# Altium schematic symbol library FPGA_Xilinx_Virtex7.SchLib: 34 symbols (part 5 of 26) (continued)
## XC7VH580T-FLG1155 (continued)

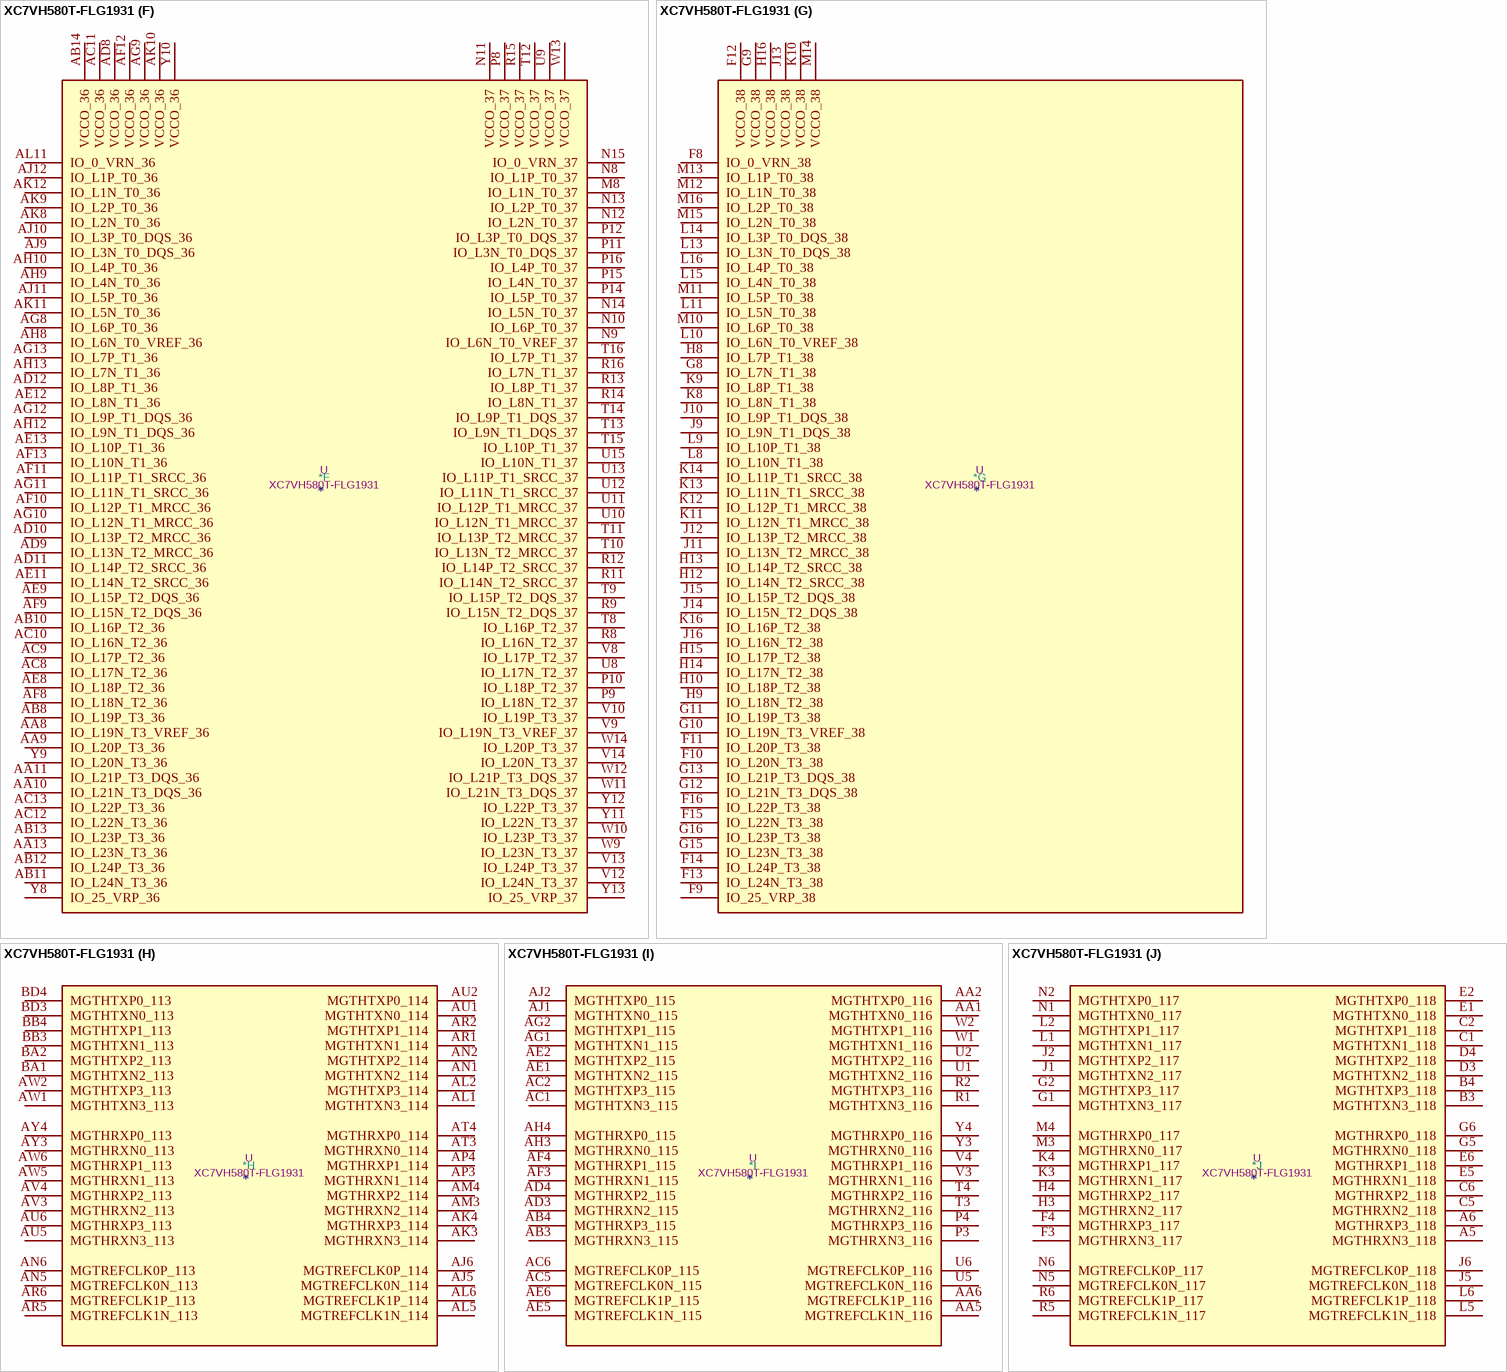
[diagram p29: symbol XC7VH580T-FLG1931]

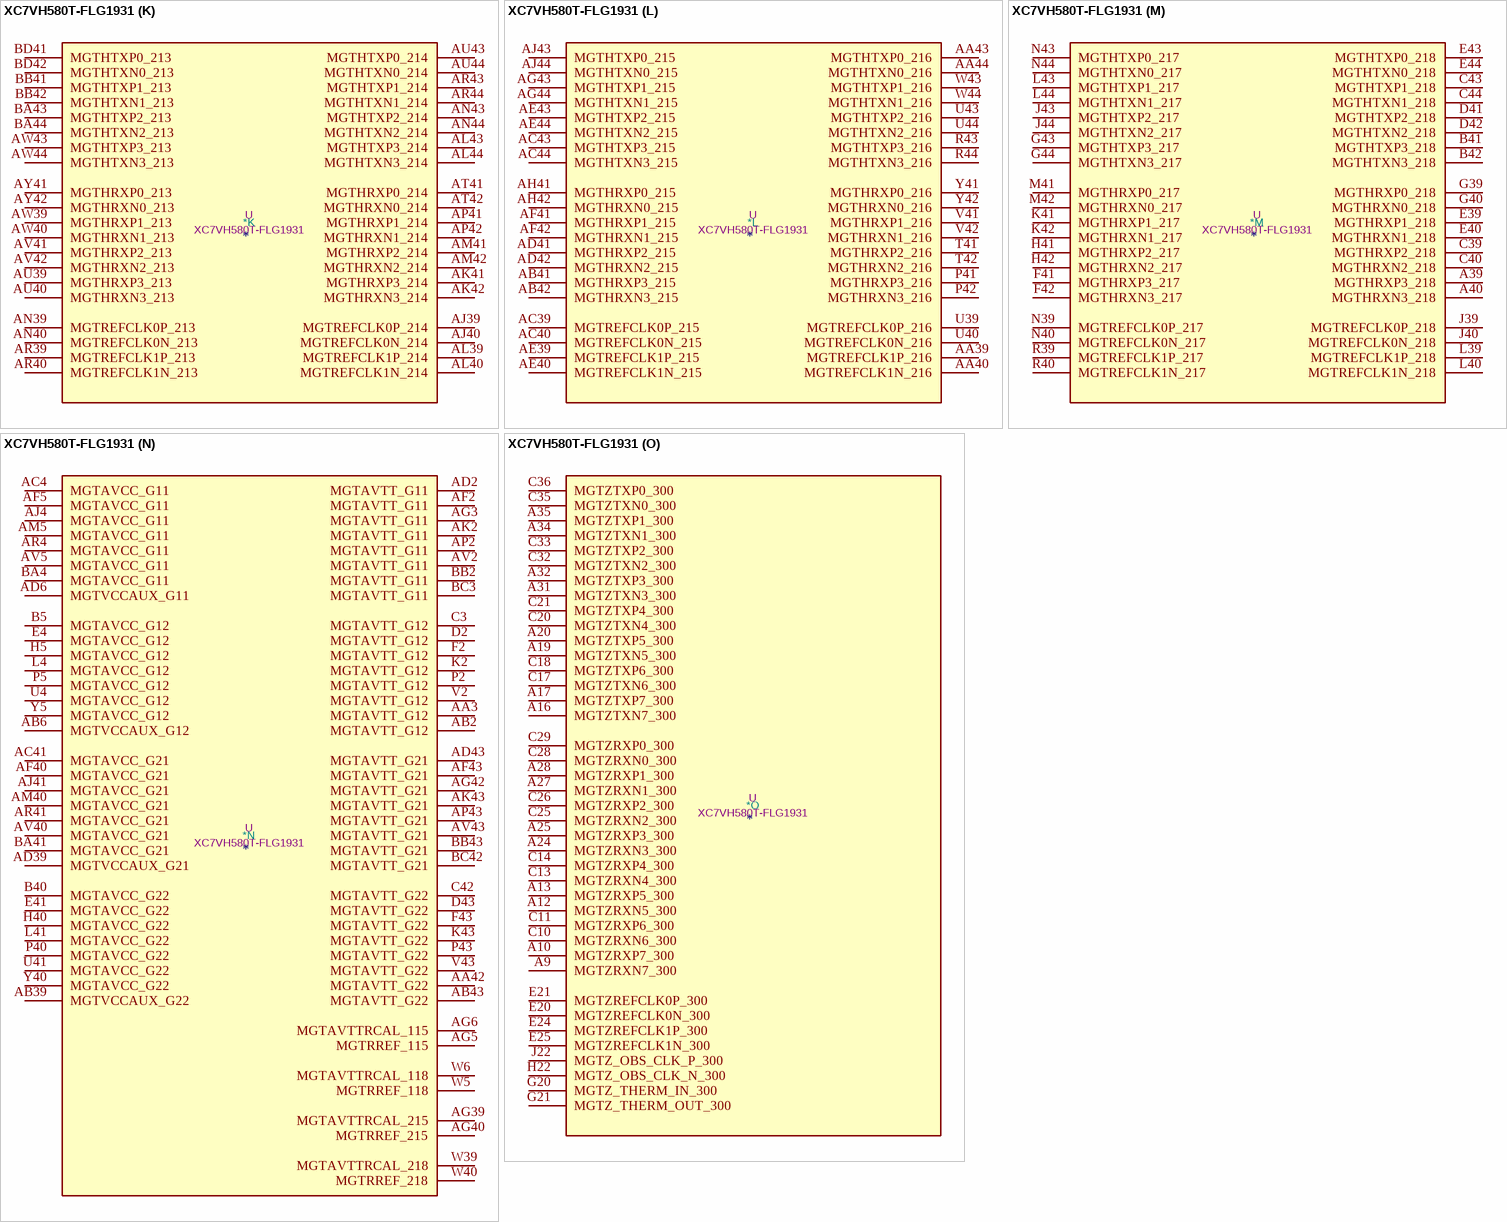
[diagram p30: symbol XC7VH580T-FLG1931]

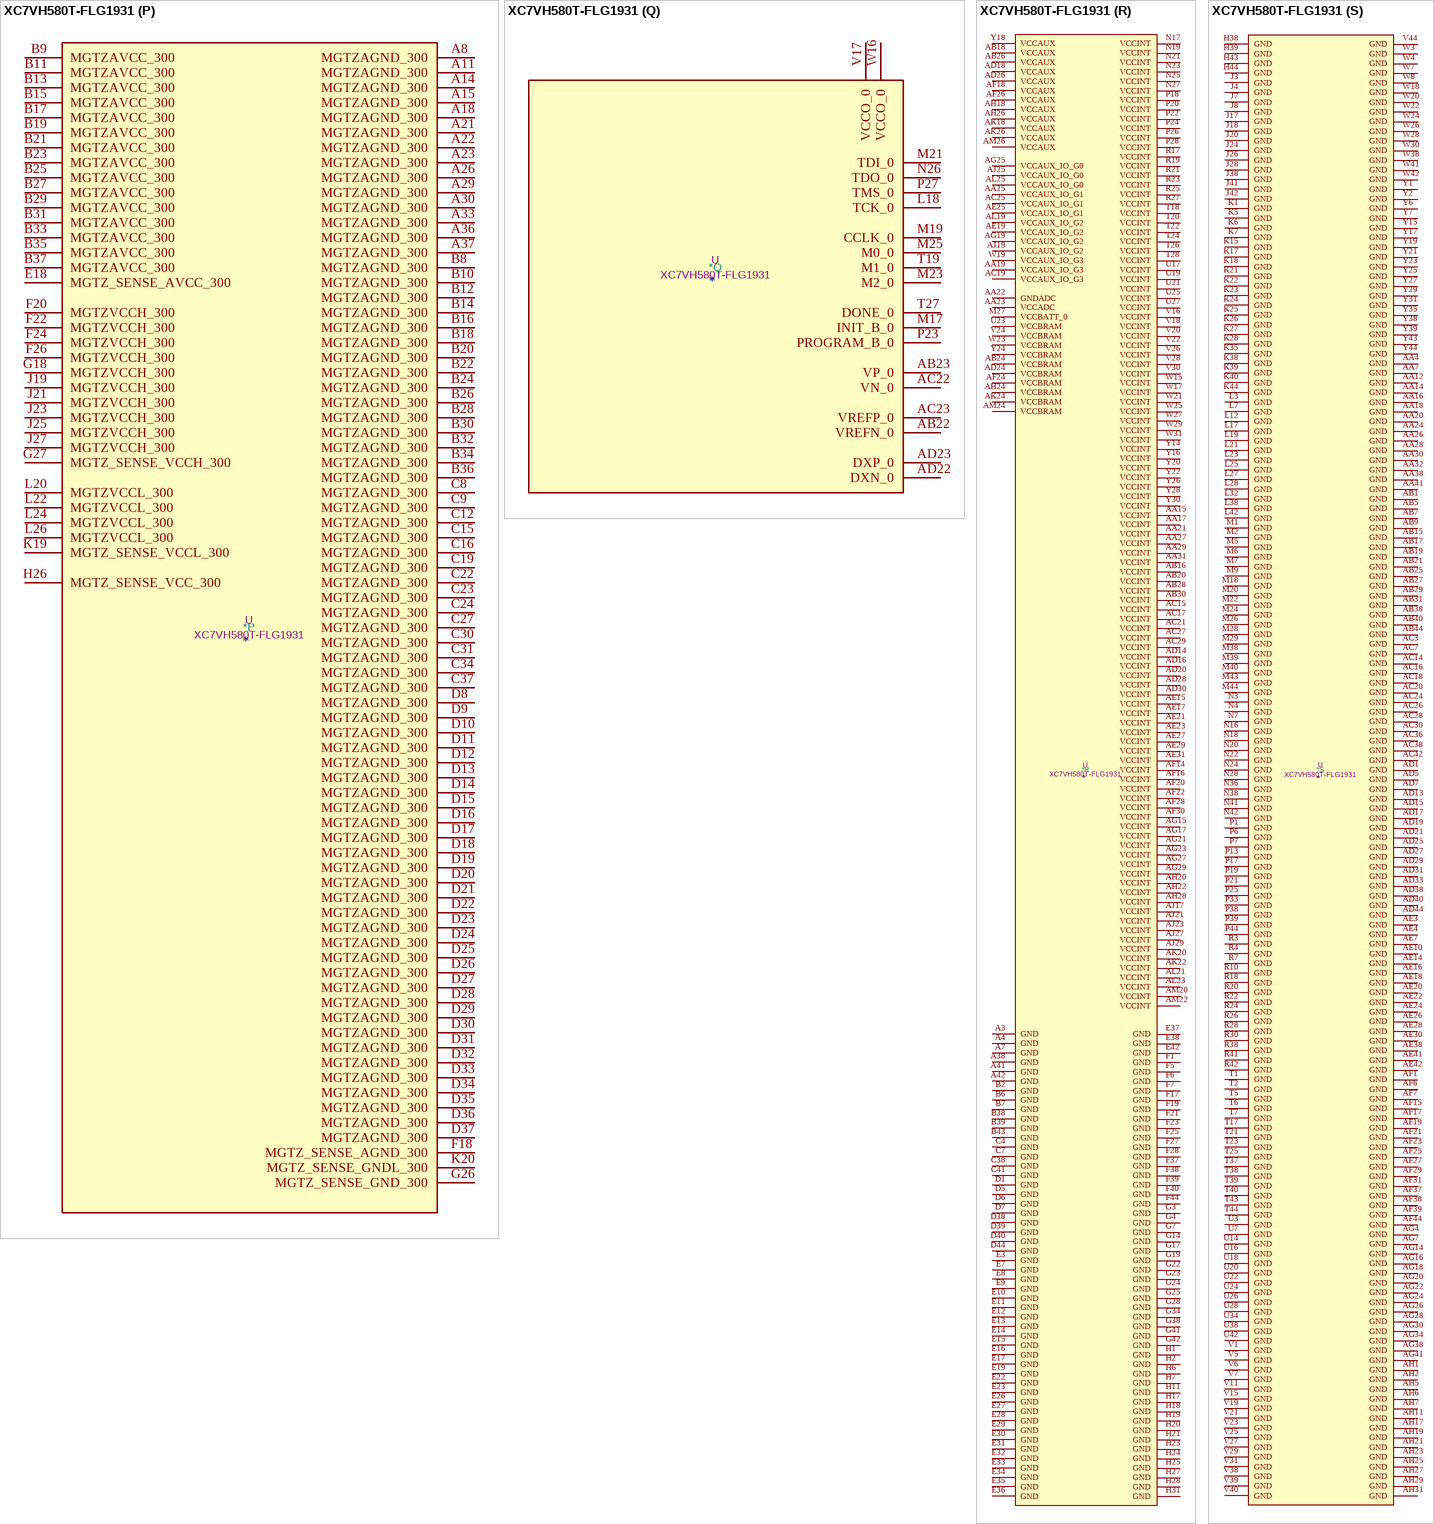
[diagram p31: symbol XC7VH580T-FLG1931]

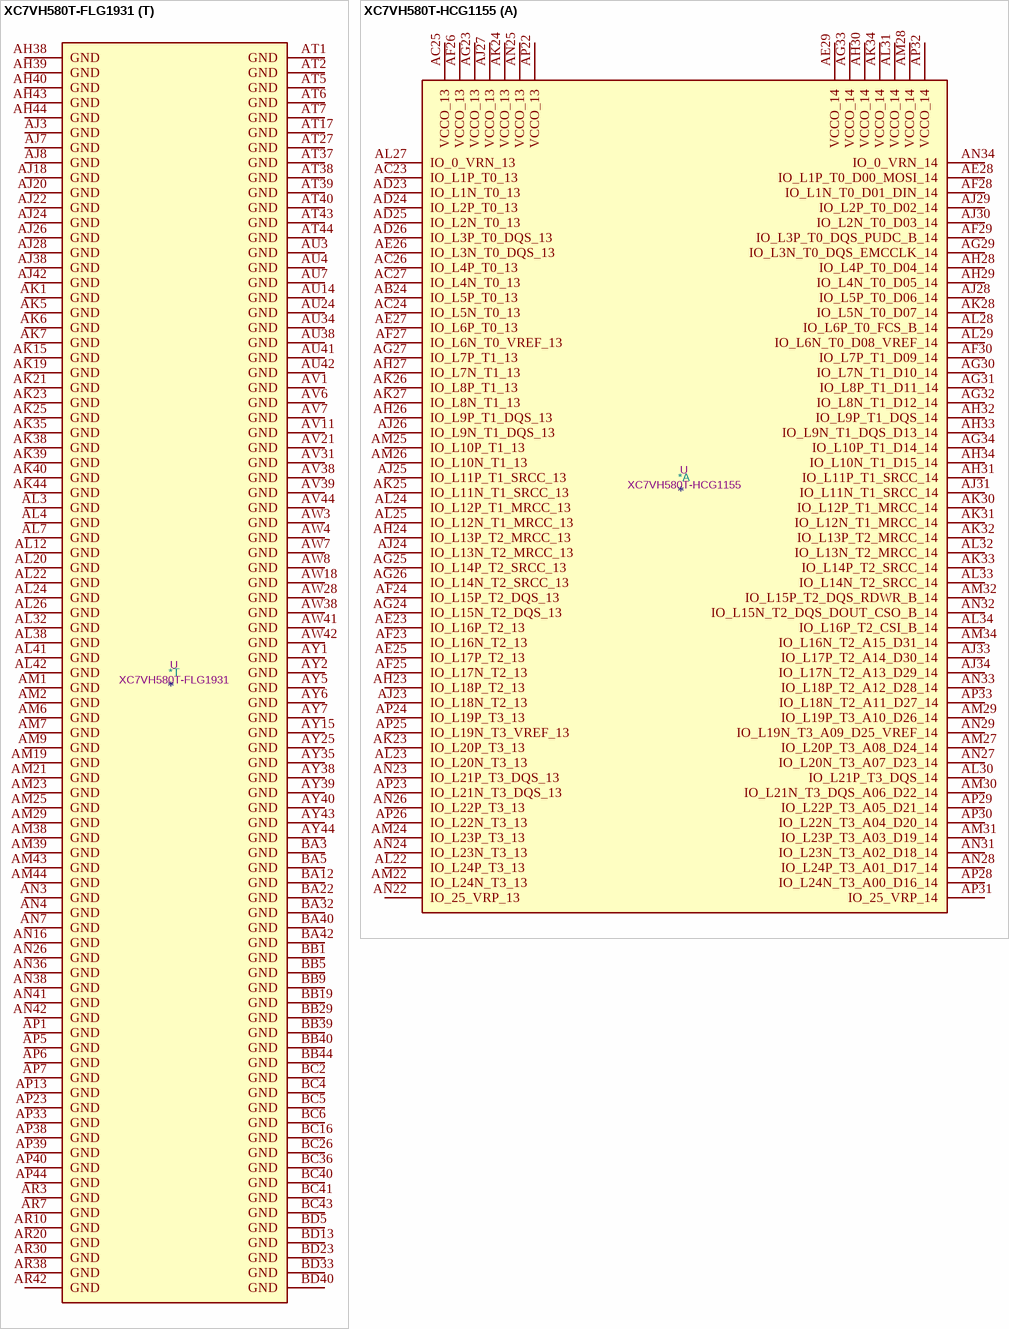
[diagram p32: symbols XC7VH580T-FLG1931 to XC7VH580T-HCG1155]

## XC7VH580T-FLG1931
designator *  value XC7VH580T-FLG1931  Reference: U
ki_keywords: FPGA; ki_description: Virtex 7 HT 580 XC7VH580T-FLG1931
part A pins: AH30 IO_L20P_T3_A08_D24_14, AJ30 IO_L20N_T3_A07_D23_14, AJ31 IO_L16P_T2_CSI_B_14, AJ32 IO_L7P_T1_D09_14, AK30 VCCO_14, AK31 IO_L16N_T2_A15_D31_14, AK32 IO_L7N_T1_D10_14, AL30 IO_L24P_T3_A01_D17_14, AL31 IO_L18P_T2_A12_D28_14, AL35 IO_L1P_T0_13, AL36 IO_L3P_T0_DQS_13, AL37 VCCO_13, AM30 IO_L24N_T3_A00_D16_14, AM31 IO_L18N_T2_A11_D27_14, AM32 IO_L9P_T1_DQS_14, AM33 IO_L5P_T0_D06_14, AM34 VCCO_13, AM35 IO_L1N_T0_13, AM36 IO_L3N_T0_DQS_13, AM37 IO_L5P_T0_13, AN30 IO_L22P_T3_A05_D21_14, AN31 VCCO_14, AN32 IO_L9N_T1_DQS_D13_14, AN33 IO_L5N_T0_D07_14, AN34 IO_L4P_T0_13, AN35 IO_L2P_T0_13, AN37 IO_L5N_T0_13, AP30 IO_L22N_T3_A04_D20_14, AP31 IO_L13P_T2_MRCC_14, AP32 IO_L11P_T1_SRCC_14, AP34 IO_L4N_T0_13, AP35 IO_L2N_T0_13, AP36 IO_L6P_T0_13, AP37 IO_L7P_T1_13, AR31 IO_L13N_T2_MRCC_14, AR32 IO_L11N_T1_SRCC_14, AR33 IO_L1P_T0_D00_MOSI_14, AR34 IO_L10P_T1_13, AR35 VCCO_13, AR36 IO_L6N_T0_VREF_13, AR37 IO_L7N_T1_13, AT30 IO_L21P_T3_DQS_14, AT31 IO_L14P_T2_SRCC_14, AT32 VCCO_14, AT33 IO_L1N_T0_D01_DIN_14, AT34 IO_L10N_T1_13, AT35 IO_L11P_T1_SRCC_13, AT36 IO_L12P_T1_MRCC_13, AU30 IO_L21N_T3_DQS_A06_D22_14, AU31 IO_L14N_T2_SRCC_14, AU32 IO_L12P_T1_MRCC_14, AU33 IO_L3P_T0_DQS_PUDC_B_14, AU35 IO_L11N_T1_SRCC_13, AU36 IO_L12N_T1_MRCC_13, AU37 IO_L9P_T1_DQS_13, AV30 IO_L23P_T3_A03_D19_14, AV32 IO_L12N_T1_MRCC_14, AV33 IO_L3N_T0_DQS_EMCCLK_14, AV34 IO_L16P_T2_13, AV35 IO_L13P_T2_MRCC_13, AV36 VCCO_13, AV37 IO_L9N_T1_DQS_13, AW30 IO_L23N_T3_A02_D18_14, AW31 IO_L15P_T2_DQS_RDWR_B_14, AW32 IO_L8P_T1_D11_14, AW33 VCCO_14, AW34 IO_L16N_T2_13, AW35 IO_L13N_T2_MRCC_13, AW36 IO_L14P_T2_SRCC_13, AW37 IO_L8P_T1_13, AY30 VCCO_14, AY31 IO_L15N_T2_DQS_DOUT_CSO_B_14, AY32 IO_L8N_T1_D12_14, AY33 IO_L4P_T0_D04_14, AY34 IO_L17P_T2_13, AY36 IO_L14N_T2_SRCC_13, AY37 IO_L8N_T1_13, BA30 IO_L19P_T3_A10_D26_14, BA31 IO_L17P_T2_A14_D30_14, BA33 IO_L4N_T0_D05_14, BA34 IO_L17N_T2_13, BA35 IO_L15P_T2_DQS_13, BA36 IO_L18P_T2_13, BA37 VCCO_13, BA38 IO_L22P_T3_13, BA39 IO_L22N_T3_13, BB30 IO_L19N_T3_A09_D25_VREF_14, BB31 IO_L17N_T2_A13_D29_14, BB32 IO_L10P_T1_D14_14, BB33 IO_L6P_T0_FCS_B_14, BB34 VCCO_13, BB35 IO_L15N_T2_DQS_13, BB36 IO_L18N_T2_13, BB37 IO_L21P_T3_DQS_13, BB38 IO_L19P_T3_13, BC30 IO_25_VRP_14, BC31 VCCO_14, BC32 IO_L10N_T1_D15_14, BC33 IO_L6N_T0_D08_VREF_14, BC34 IO_L23P_T3_13, BC35 IO_L24P_T3_13, BC37 IO_L21N_T3_DQS_13, BC38 IO_L19N_T3_VREF_13, BC39 IO_25_VRP_13, BD30 IO_0_VRN_14, BD31 IO_L2P_T0_D02_14, BD32 IO_L2N_T0_D03_14, BD34 IO_L23N_T3_13, BD35 IO_L24N_T3_13, BD36 IO_L20P_T3_13, BD37 IO_L20N_T3_13, BD38 VCCO_13, BD39 IO_0_VRN_13
part B pins: AA33 IO_L2P_T0_16, AA34 IO_L2N_T0_16, AA35 IO_L3P_T0_DQS_16, AA36 IO_L3N_T0_DQS_16, AA37 VCCO_16, AB32 IO_L1P_T0_16, AB33 IO_L1N_T0_16, AB34 VCCO_16, AB35 IO_L5P_T0_16, AB36 IO_L6P_T0_16, AB37 IO_L6N_T0_VREF_16, AC31 VCCO_16, AC32 IO_L16P_T2_16, AC33 IO_L4P_T0_16, AC34 IO_L4N_T0_16, AC35 IO_L5N_T0_16, AC37 IO_L7P_T1_16, AD32 IO_L16N_T2_16, AD34 IO_L10P_T1_16, AD35 IO_L8P_T1_16, AD36 IO_L8N_T1_16, AD37 IO_L7N_T1_16, AE32 IO_L15P_T2_DQS_16, AE33 IO_L15N_T2_DQS_16, AE34 IO_L10N_T1_16, AE35 VCCO_16, AE36 IO_L9P_T1_DQS_16, AE37 IO_L9N_T1_DQS_16, AF32 VCCO_16, AF33 IO_L11P_T1_SRCC_16, AF34 IO_L11N_T1_SRCC_16, AF35 IO_L12P_T1_MRCC_16, AF36 IO_L12N_T1_MRCC_16, AG31 IO_L17P_T2_16, AG32 IO_L13P_T2_MRCC_16, AG33 IO_L13N_T2_MRCC_16, AG35 IO_L14P_T2_SRCC_16, AG36 IO_L14N_T2_SRCC_16, AG37 IO_L20P_T3_16, AH32 IO_L17N_T2_16, AH33 IO_L18P_T2_16, AH34 IO_L18N_T2_16, AH35 IO_L24P_T3_16, AH36 VCCO_16, AH37 IO_L20N_T3_16, AJ33 VCCO_16, AJ34 IO_L19P_T3_16, AJ35 IO_L24N_T3_16, AJ36 IO_L21P_T3_DQS_16, AJ37 IO_L21N_T3_DQS_16, AK27 IO_25_VRP_15, AK28 IO_L18P_T2_A24_15, AK29 IO_L22P_T3_A17_15, AK33 IO_L23P_T3_16, AK34 IO_L19N_T3_VREF_16, AK36 IO_L22P_T3_16, AK37 IO_L22N_T3_16, AL27 VCCO_15, AL28 IO_L18N_T2_A23_15, AL29 IO_L22N_T3_A16_15, AL33 IO_L23N_T3_16, AL34 IO_25_VRP_16, AM27 IO_L7P_T1_AD2P_15, AM28 IO_L16P_T2_A28_15, AN25 IO_L1P_T0_AD0P_15, AN27 IO_L7N_T1_AD2N_15, AN28 IO_L16N_T2_A27_15, AN29 IO_L20P_T3_A20_15, AP25 IO_L1N_T0_AD0N_15, AP26 IO_L5P_T0_AD9P_15, AP27 IO_L9P_T1_DQS_AD3P_15, AP28 VCCO_15, AP29 IO_L20N_T3_A19_15, AR25 VCCO_15, AR26 IO_L5N_T0_AD9N_15, AR27 IO_L9N_T1_DQS_AD3N_15, AR28 IO_L14P_T2_SRCC_15, AR29 IO_L24P_T3_RS1_15, AT25 IO_L4P_T0_15, AT26 IO_L3P_T0_DQS_AD1P_15, AT28 IO_L14N_T2_SRCC_15, AT29 IO_L24N_T3_RS0_15, AU25 IO_L4N_T0_15, AU26 IO_L3N_T0_DQS_AD1N_15, AU27 IO_L11P_T1_SRCC_15, AU28 IO_L13P_T2_MRCC_15, AU29 VCCO_15, AV25 IO_0_VRN_15, AV26 VCCO_15, AV27 IO_L11N_T1_SRCC_15, AV28 IO_L13N_T2_MRCC_15, AV29 IO_L21P_T3_DQS_15, AW26 IO_L6P_T0_15, AW27 IO_L12P_T1_MRCC_15, AW29 IO_L21N_T3_DQS_A18_15, AY26 IO_L6N_T0_VREF_15, AY27 IO_L12N_T1_MRCC_15, AY28 IO_L15P_T2_DQS_15, AY29 IO_L19P_T3_A22_15, BA26 IO_L2P_T0_AD8P_15, BA27 VCCO_15, BA28 IO_L15N_T2_DQS_ADV_B_15, BA29 IO_L19N_T3_A21_VREF_15, BB26 IO_L2N_T0_AD8N_15, BB27 IO_L10P_T1_AD11P_15, BB28 IO_L17P_T2_A26_15, BC27 IO_L10N_T1_AD11N_15, BC28 IO_L17N_T2_A25_15, BC29 IO_L23P_T3_FOE_B_15, BD26 IO_L8P_T1_AD10P_15, BD27 IO_L8N_T1_AD10N_15, BD28 VCCO_15, BD29 IO_L23N_T3_FWE_B_15, Y37 IO_0_VRN_16
part C pins: F29 IO_L22P_T3_18, F30 IO_L22N_T3_18, F31 IO_25_VRP_18, F32 VCCO_18, F33 IO_L24P_T3_18, F34 IO_L24N_T3_18, F35 IO_L20P_T3_18, F36 IO_L20N_T3_18, G29 VCCO_18, G30 IO_L23P_T3_18, G31 IO_L23N_T3_18, G32 IO_L21P_T3_DQS_18, G33 IO_L21N_T3_DQS_18, G35 IO_L19P_T3_18, G36 IO_L19N_T3_VREF_18, G37 IO_L7N_T1_18, H29 IO_L17P_T2_18, H30 IO_L17N_T2_18, H32 IO_L15P_T2_DQS_18, H33 IO_L15N_T2_DQS_18, H34 IO_L18P_T2_18, H35 IO_L18N_T2_18, H36 VCCO_18, H37 IO_L7P_T1_18, J29 IO_L16P_T2_18, J30 IO_L16N_T2_18, J31 IO_L14P_T2_SRCC_18, J32 IO_L14N_T2_SRCC_18, J33 VCCO_18, J34 IO_L13P_T2_MRCC_18, J35 IO_L13N_T2_MRCC_18, J36 IO_L9P_T1_DQS_18, J37 IO_L9N_T1_DQS_18, K29 IO_L10N_T1_18, K30 VCCO_18, K31 IO_L11P_T1_SRCC_18, K32 IO_L11N_T1_SRCC_18, K33 IO_L12P_T1_MRCC_18, K34 IO_L12N_T1_MRCC_18, K36 IO_L8N_T1_18, K37 IO_0_VRN_18, L29 IO_L10P_T1_18, L30 IO_L4P_T0_18, L31 IO_L4N_T0_18, L33 IO_L3P_T0_DQS_18, L34 IO_L3N_T0_DQS_18, L35 IO_L6N_T0_VREF_18, L36 IO_L8P_T1_18, L37 VCCO_18, M30 IO_L2P_T0_18, M31 IO_L2N_T0_18, M32 IO_L1P_T0_18, M33 IO_L1N_T0_18, M34 VCCO_18, M35 IO_L6P_T0_18, M36 IO_L5P_T0_18, M37 IO_L5N_T0_18, N29 IO_L4P_T0_17, N30 IO_L4N_T0_17, N31 VCCO_17, N32 IO_L2P_T0_17, N33 IO_L2N_T0_17, N34 IO_L6P_T0_17, N35 IO_L6N_T0_VREF_17, N37 IO_L1N_T0_17, P29 IO_L5P_T0_17, P30 IO_L5N_T0_17, P31 IO_L3P_T0_DQS_17, P32 IO_L3N_T0_DQS_17, P34 IO_0_VRN_17, P35 IO_L15P_T2_DQS_17, P36 IO_L15N_T2_DQS_17, P37 IO_L1P_T0_17, R29 IO_L8N_T1_17, R31 IO_L7P_T1_17, R32 IO_L7N_T1_17, R33 IO_L16P_T2_17, R34 IO_L16N_T2_17, R35 VCCO_17, R36 IO_L18P_T2_17, R37 IO_L18N_T2_17, T29 IO_L8P_T1_17, T30 IO_L9N_T1_DQS_17, T31 IO_L10N_T1_17, T32 VCCO_17, T33 IO_L13P_T2_MRCC_17, T34 IO_L13N_T2_MRCC_17, T35 IO_L14P_T2_SRCC_17, T36 IO_L14N_T2_SRCC_17, U29 VCCO_17, U30 IO_L9P_T1_DQS_17, U31 IO_L10P_T1_17, U32 IO_L11P_T1_SRCC_17, U33 IO_L11N_T1_SRCC_17, U35 IO_L12P_T1_MRCC_17, U36 IO_L12N_T1_MRCC_17, U37 IO_L17N_T2_17, V32 IO_L20P_T3_17, V33 IO_L20N_T3_17, V34 IO_L24P_T3_17, V35 IO_L24N_T3_17, V36 VCCO_17, V37 IO_L17P_T2_17, W32 IO_L19N_T3_VREF_17, W33 VCCO_17, W34 IO_L21P_T3_DQS_17, W35 IO_L21N_T3_DQS_17, W36 IO_L23P_T3_17, W37 IO_L23N_T3_17, Y32 IO_L19P_T3_17, Y33 IO_L22P_T3_17, Y34 IO_L22N_T3_17, Y36 IO_25_VRP_17
part D pins: AH14 IO_L6P_T0_33, AH15 IO_L10P_T1_33, AJ13 VCCO_33, AJ14 IO_L6N_T0_VREF_33, AJ15 IO_L10N_T1_33, AK13 IO_L3P_T0_DQS_33, AK14 IO_L2P_T0_33, AL13 IO_L3N_T0_DQS_33, AL14 IO_L2N_T0_33, AL15 IO_L7P_T1_33, AM12 IO_L1P_T0_33, AM13 IO_L4P_T0_33, AM14 VCCO_33, AM15 IO_L7N_T1_33, AN11 VCCO_32, AN12 IO_L1N_T0_33, AN13 IO_L4N_T0_33, AN14 IO_L9P_T1_DQS_33, AN15 IO_L8P_T1_33, AP8 VCCO_32, AP12 IO_L5P_T0_33, AP14 IO_L9N_T1_DQS_33, AP15 IO_L8N_T1_33, AR12 IO_L5N_T0_33, AR13 IO_L12P_T1_MRCC_33, AR14 IO_L11P_T1_SRCC_33, AR15 VCCO_33, AT12 VCCO_33, AT13 IO_L12N_T1_MRCC_33, AT14 IO_L11N_T1_SRCC_33, AT15 IO_L18P_T2_33, AU9 VCCO_32, AU12 IO_L15P_T2_DQS_33, AU13 IO_L13P_T2_MRCC_33, AU15 IO_L18N_T2_33, AV12 IO_L15N_T2_DQS_33, AV13 IO_L13N_T2_MRCC_33, AV14 IO_L14P_T2_SRCC_33, AV15 IO_L16P_T2_33, AW12 IO_L17P_T2_33, AW13 VCCO_33, AW14 IO_L14N_T2_SRCC_33, AW15 IO_L16N_T2_33, AY10 VCCO_32, AY12 IO_L17N_T2_33, AY13 IO_L19P_T3_33, AY14 IO_L20P_T3_33, BA7 VCCO_32, BA13 IO_L19N_T3_VREF_33, BA14 IO_L20N_T3_33, BA15 IO_L23P_T3_33, BB12 IO_L21N_T3_DQS_33, BB13 IO_L21P_T3_DQS_33, BB14 VCCO_33, BB15 IO_L23N_T3_33, BC11 VCCO_32, BC12 IO_L24N_T3_33, BC13 IO_L24P_T3_33, BC14 IO_L22N_T3_33, BC15 IO_L22P_T3_33, BD8 VCCO_32, BD12 IO_0_VRN_33, BD14 IO_25_VRP_33
part E pins: AH16 VCCO_34, AJ16 IO_L23P_T3_34, AK16 IO_L23N_T3_34, AK17 IO_L19P_T3_34, AL16 IO_L19N_T3_VREF_34, AL17 VCCO_34, AL18 IO_L21P_T3_DQS_34, AM16 IO_L24N_T3_34, AM17 IO_L24P_T3_34, AM18 IO_L21N_T3_DQS_34, AN17 IO_L20N_T3_34, AN18 IO_L20P_T3_34, AN19 IO_L22P_T3_34, AN20 IO_L22P_T3_35, AN21 VCCO_35, AN22 IO_L7N_T1_AD6N_35, AN23 IO_L7P_T1_AD6P_35, AN24 IO_L1P_T0_AD4P_35, AP16 IO_L16P_T2_34, AP17 IO_L17P_T2_34, AP18 VCCO_34, AP19 IO_L22N_T3_34, AP20 IO_L22N_T3_35, AP21 IO_L16P_T2_35, AP22 IO_L18P_T2_35, AP24 IO_L1N_T0_AD4N_35, AR16 IO_L16N_T2_34, AR17 IO_L17N_T2_34, AR18 IO_L15P_T2_DQS_34, AR19 IO_L18P_T2_34, AR21 IO_L16N_T2_35, AR22 IO_L18N_T2_35, AR23 IO_L9P_T1_DQS_AD7P_35, AR24 IO_L5P_T0_AD13P_35, AT16 IO_L10P_T1_34, AT18 IO_L15N_T2_DQS_34, AT19 IO_L18N_T2_34, AT20 IO_L20P_T3_35, AT21 IO_L15P_T2_DQS_35, AT22 VCCO_35, AT23 IO_L9N_T1_DQS_AD7N_35, AT24 IO_L5N_T0_AD13N_35, AU16 IO_L10N_T1_34, AU17 IO_L14N_T2_SRCC_34, AU18 IO_L14P_T2_SRCC_34, AU19 VCCO_34, AU20 IO_L20N_T3_35, AU21 IO_L15N_T2_DQS_35, AU22 IO_L14P_T2_SRCC_35, AU23 IO_L12P_T1_MRCC_35, AV16 VCCO_34, AV17 IO_L13N_T2_MRCC_34, AV18 IO_L13P_T2_MRCC_34, AV19 IO_L8P_T1_34, AV20 IO_L24P_T3_35, AV22 IO_L14N_T2_SRCC_35, AV23 IO_L12N_T1_MRCC_35, AV24 IO_L3P_T0_DQS_AD5P_35, AW16 IO_L9P_T1_DQS_34, AW17 IO_L11P_T1_SRCC_34, AW19 IO_L8N_T1_34, AW20 IO_L24N_T3_35, AW21 IO_L21P_T3_DQS_35, AW22 IO_L13P_T2_MRCC_35, AW23 VCCO_35, AW24 IO_L3N_T0_DQS_AD5N_35, AW25 IO_0_VRN_35, AY16 IO_L9N_T1_DQS_34, AY17 IO_L11N_T1_SRCC_34, AY18 IO_L12N_T1_MRCC_34, AY19 IO_L12P_T1_MRCC_34, AY20 VCCO_35, AY21 IO_L21N_T3_DQS_35, AY22 IO_L13N_T2_MRCC_35, AY23 IO_L11P_T1_SRCC_35, AY24 IO_L4P_T0_35, BA16 IO_L6P_T0_34, BA17 VCCO_34, BA18 IO_L4P_T0_34, BA19 IO_L7N_T1_34, BA20 IO_L7P_T1_34, BA21 IO_L23P_T3_35, BA23 IO_L11N_T1_SRCC_35, BA24 IO_L4N_T0_35, BA25 IO_L2P_T0_AD12P_35, BB16 IO_L6N_T0_VREF_34, BB17 IO_L5P_T0_34, BB18 IO_L4N_T0_34, BB20 IO_25_VRP_35, BB21 IO_L23N_T3_35, BB22 IO_L17P_T2_35, BB23 IO_L8P_T1_AD14P_35, BB24 VCCO_35, BB25 IO_L2N_T0_AD12N_35, BC17 IO_L5N_T0_34, BC18 IO_L3N_T0_DQS_34, BC19 IO_L3P_T0_DQS_34, BC20 IO_0_VRN_34, BC21 VCCO_35, BC22 IO_L17N_T2_35, BC23 IO_L8N_T1_AD14N_35, BC24 IO_L10P_T1_AD15P_35, BC25 IO_L6P_T0_35, BD15 IO_25_VRP_34, BD16 IO_L2N_T0_34, BD17 IO_L2P_T0_34, BD18 VCCO_34, BD19 IO_L1N_T0_34, BD20 IO_L1P_T0_34, BD21 IO_L19N_T3_VREF_35, BD22 IO_L19P_T3_35, BD24 IO_L10N_T1_AD15N_35, BD25 IO_L6N_T0_VREF_35
part F pins: AA8 IO_L19N_T3_VREF_36, AA9 IO_L20P_T3_36, AA10 IO_L21N_T3_DQS_36, AA11 IO_L21P_T3_DQS_36, AA13 IO_L23N_T3_36, AB8 IO_L19P_T3_36, AB10 IO_L16P_T2_36, AB11 IO_L24N_T3_36, AB12 IO_L24P_T3_36, AB13 IO_L23P_T3_36, AB14 VCCO_36, AC8 IO_L17N_T2_36, AC9 IO_L17P_T2_36, AC10 IO_L16N_T2_36, AC11 VCCO_36, AC12 IO_L22N_T3_36, AC13 IO_L22P_T3_36, AD8 VCCO_36, AD9 IO_L13N_T2_MRCC_36, AD10 IO_L13P_T2_MRCC_36, AD11 IO_L14P_T2_SRCC_36, AD12 IO_L8P_T1_36, AE8 IO_L18P_T2_36, AE9 IO_L15P_T2_DQS_36, AE11 IO_L14N_T2_SRCC_36, AE12 IO_L8N_T1_36, AE13 IO_L10P_T1_36, AF8 IO_L18N_T2_36, AF9 IO_L15N_T2_DQS_36, AF10 IO_L12P_T1_MRCC_36, AF11 IO_L11P_T1_SRCC_36, AF12 VCCO_36, AF13 IO_L10N_T1_36, AG8 IO_L6P_T0_36, AG9 VCCO_36, AG10 IO_L12N_T1_MRCC_36, AG11 IO_L11N_T1_SRCC_36, AG12 IO_L9P_T1_DQS_36, AG13 IO_L7P_T1_36, AH8 IO_L6N_T0_VREF_36, AH9 IO_L4N_T0_36, AH10 IO_L4P_T0_36, AH12 IO_L9N_T1_DQS_36, AH13 IO_L7N_T1_36, AJ9 IO_L3N_T0_DQS_36, AJ10 IO_L3P_T0_DQS_36, AJ11 IO_L5P_T0_36, AJ12 IO_L1P_T0_36, AK8 IO_L2N_T0_36, AK9 IO_L2P_T0_36, AK10 VCCO_36, AK11 IO_L5N_T0_36, AK12 IO_L1N_T0_36, AL11 IO_0_VRN_36, M8 IO_L1N_T0_37, N8 IO_L1P_T0_37, N9 IO_L6N_T0_VREF_37, N10 IO_L6P_T0_37, N11 VCCO_37, N12 IO_L2N_T0_37, N13 IO_L2P_T0_37, N14 IO_L5N_T0_37, N15 IO_0_VRN_37, P8 VCCO_37, P9 IO_L18N_T2_37, P10 IO_L18P_T2_37, P11 IO_L3N_T0_DQS_37, P12 IO_L3P_T0_DQS_37, P14 IO_L5P_T0_37, P15 IO_L4N_T0_37, P16 IO_L4P_T0_37, R8 IO_L16N_T2_37, R9 IO_L15N_T2_DQS_37, R11 IO_L14N_T2_SRCC_37, R12 IO_L14P_T2_SRCC_37, R13 IO_L8P_T1_37, R14 IO_L8N_T1_37, R15 VCCO_37, R16 IO_L7N_T1_37, T8 IO_L16P_T2_37, T9 IO_L15P_T2_DQS_37, T10 IO_L13N_T2_MRCC_37, T11 IO_L13P_T2_MRCC_37, T12 VCCO_37, T13 IO_L9N_T1_DQS_37, T14 IO_L9P_T1_DQS_37, T15 IO_L10P_T1_37, T16 IO_L7P_T1_37, U8 IO_L17N_T2_37, U9 VCCO_37, U10 IO_L12N_T1_MRCC_37, U11 IO_L12P_T1_MRCC_37, U12 IO_L11N_T1_SRCC_37, U13 IO_L11P_T1_SRCC_37, U15 IO_L10N_T1_37, V8 IO_L17P_T2_37, V9 IO_L19N_T3_VREF_37, V10 IO_L19P_T3_37, V12 IO_L24N_T3_37, V13 IO_L24P_T3_37, V14 IO_L20N_T3_37, W9 IO_L23N_T3_37, W10 IO_L23P_T3_37, W11 IO_L21N_T3_DQS_37, W12 IO_L21P_T3_DQS_37, W13 VCCO_37, W14 IO_L20P_T3_37, Y8 IO_25_VRP_36, Y9 IO_L20N_T3_36, Y10 VCCO_36, Y11 IO_L22N_T3_37, Y12 IO_L22P_T3_37, Y13 IO_25_VRP_37
part G pins: F8 IO_0_VRN_38, F9 IO_25_VRP_38, F10 IO_L20N_T3_38, F11 IO_L20P_T3_38, F12 VCCO_38, F13 IO_L24N_T3_38, F14 IO_L24P_T3_38, F15 IO_L22N_T3_38, F16 IO_L22P_T3_38, G8 IO_L7N_T1_38, G9 VCCO_38, G10 IO_L19N_T3_VREF_38, G11 IO_L19P_T3_38, G12 IO_L21N_T3_DQS_38, G13 IO_L21P_T3_DQS_38, G15 IO_L23N_T3_38, G16 IO_L23P_T3_38, H8 IO_L7P_T1_38, H9 IO_L18N_T2_38, H10 IO_L18P_T2_38, H12 IO_L14N_T2_SRCC_38, H13 IO_L14P_T2_SRCC_38, H14 IO_L17N_T2_38, H15 IO_L17P_T2_38, H16 VCCO_38, J9 IO_L9N_T1_DQS_38, J10 IO_L9P_T1_DQS_38, J11 IO_L13N_T2_MRCC_38, J12 IO_L13P_T2_MRCC_38, J13 VCCO_38, J14 IO_L15N_T2_DQS_38, J15 IO_L15P_T2_DQS_38, J16 IO_L16N_T2_38, K8 IO_L8N_T1_38, K9 IO_L8P_T1_38, K10 VCCO_38, K11 IO_L12N_T1_MRCC_38, K12 IO_L12P_T1_MRCC_38, K13 IO_L11N_T1_SRCC_38, K14 IO_L11P_T1_SRCC_38, K16 IO_L16P_T2_38, L8 IO_L10N_T1_38, L9 IO_L10P_T1_38, L10 IO_L6N_T0_VREF_38, L11 IO_L5N_T0_38, L13 IO_L3N_T0_DQS_38, L14 IO_L3P_T0_DQS_38, L15 IO_L4N_T0_38, L16 IO_L4P_T0_38, M10 IO_L6P_T0_38, M11 IO_L5P_T0_38, M12 IO_L1N_T0_38, M13 IO_L1P_T0_38, M14 VCCO_38, M15 IO_L2N_T0_38, M16 IO_L2P_T0_38